# Altium footprint library Footprints.PcbLib: 207 footprints (part 11 of 13)
Each footprint in its own frame and in the unit in brackets; x right, y up, seen from the top. Pads: shape width x height; smd on the part's side, far side on the other; paste and mask are expansions set on the pad; w line width, h text height; cw(c..) or ccw(c..) is an arc to the next point about the centre after c.
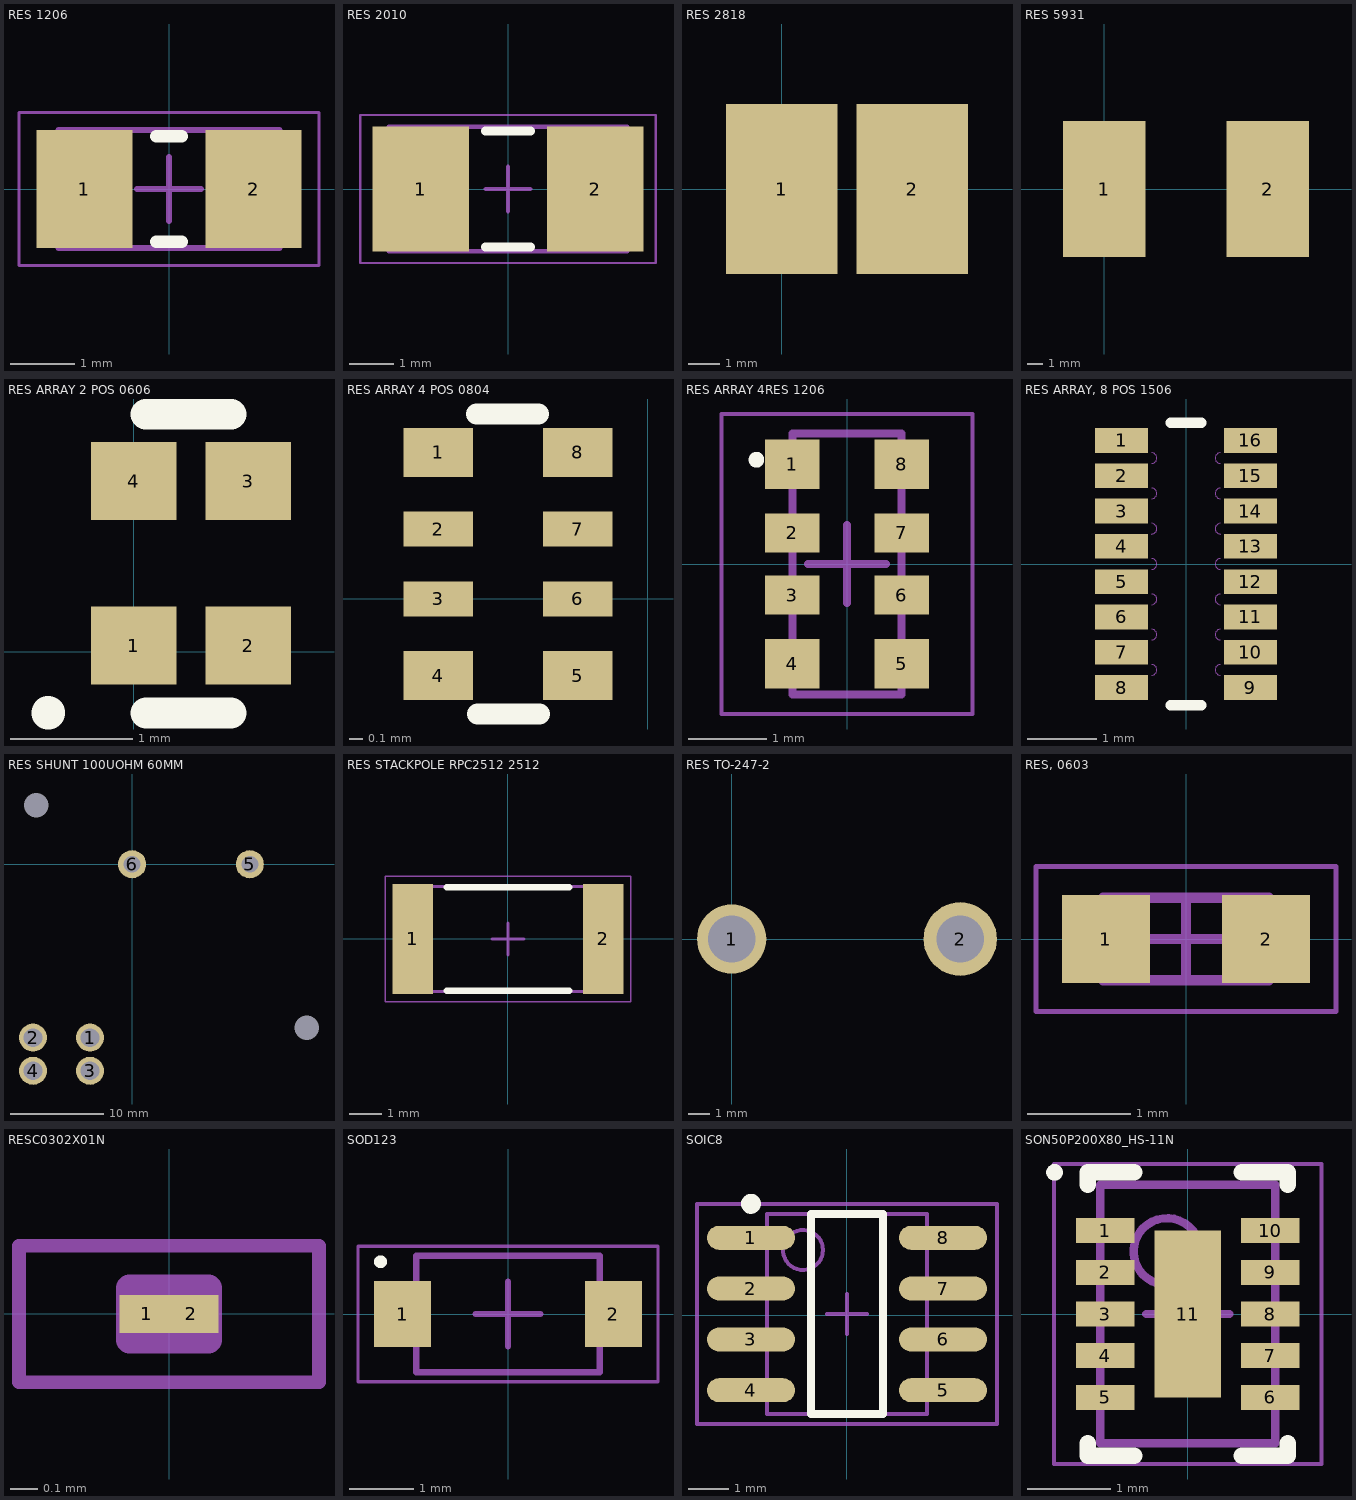
[diagram p10: the footprints below, top view; thin cyan lines are the x and y axes]

## RES 1206 [mm] "Chip Resistor, 2-Leads, Body 3.20x1.60mm, IPC Medium Density"
height 0.64
pads (2):
  rect 1.5x1.85 smd: 1(-1.325,0) 2(1.325,0)
Top Overlay:
  lines w0.2: -0.2,-0.825 0.2,-0.825 ; -0.2,0.825 0.2,0.825
Mechanical 13:
  lines w0.1: -1.725,-0.925 -1.725,0.925 1.725,0.925 1.725,-0.925 -1.725,-0.925
Mechanical 15:
  lines w0.05: -2.35,-1.2 -2.35,1.2 2.35,1.2 2.35,-1.2 -2.35,-1.2
  lines w0.1: -0.5,0 0.5,0 ; 0,-0.5 0,0.5
3D body "RES 1206.step": height 0.64, standoff 0, extent -1.725,-0.925 1.725,0.925

## RES 2010 [mm] "Chip Resistor, 2-Leads, Body 5.08x2.54mm, IPC Medium Density"
height 1.04
pads (2):
  rect 2.15x2.8 smd: 1(-1.95,0) 2(1.95,0)
Top Overlay:
  lines w0.2: -0.5,-1.3 0.5,-1.3 ; -0.5,1.3 0.5,1.3
Mechanical 13:
  lines w0.1: -2.665,-1.395 2.665,-1.395 2.665,1.395 -2.665,1.395 -2.665,-1.395
Mechanical 15:
  lines w0.05: -3.3,-1.65 3.3,-1.65 3.3,1.65 -3.3,1.65 -3.3,-1.65
  lines w0.1: -0.5,0 0.5,0 ; 0,-0.5 0,0.5
3D body "RES 2010.step": height 1.04, standoff 0, extent -2.665,-1.395 2.665,1.395

## RES 2818 [mm]
pads (2):
  rect 3.51x5.33 smd: 1(0,0) 2(4.1,0)
3D body "WSHM2818.stp": height 1.35, standoff -0.15, extent -1.525,-2.325 5.575,2.275

## RES 5931 [mm]
pads (2):
  rect 5.45x9 smd: 1(0,0) 2(10.8,0)
3D body "WSL5931 (0.003).stp": height 0.77, standoff 0, extent -2.25,-4 12.75,3.75

## RES ARRAY 2 POS 0606 [mm]
pads (4):
  rect 0.7x0.64 smd: 1(0,0.05) 2(0.94,0.05) 3(0.94,1.4) 4(0,1.4)
Top Overlay:
  circle w0.254: c-0.7,-0.5 r0.01
  lines w0.254: 0.1,-0.5 0.8,-0.5 ; 0.1,1.95 0.8,1.95
3D body "ACAS_0606.stp": height 0.45, standoff 0, extent -0.281,-0.072 1.219,1.528

## RES ARRAY 4 POS 0804 [mm] "Panasonic Electronic Components EXB-N8V511JX"
height 0.7
pads (8):
  rect 0.5x0.35 smd: 1(-1.5,1.05) 4(-1.5,-0.55) 5(-0.5,-0.55) 8(-0.5,1.05)
  rect 0.5x0.25 smd: 2(-1.5,0.5) 3(-1.5,0) 6(-0.5,0) 7(-0.5,0.5)
Top Overlay:
  lines w0.152: -1.225,1.325 -0.781,1.325 ; -1.219,-0.825 -0.775,-0.825
3D body "User Library-4xRes_0402.step": height 0.36, standoff -0.01, extent -1.5,-0.75 -0.5,1.25

## RES ARRAY 4RES 1206 [mm] "Chip Array, Flat, 8-Leads, Pitch 0.80mm,  Body 3.20x1.60mm,  IPC Medium Density"
height 1
pads (8):
  rect 0.7x0.64 smd: 1(-0.7,1.28) 4(-0.7,-1.28) 5(0.7,-1.28) 8(0.7,1.28)
  rect 0.7x0.5 smd: 2(-0.7,0.4) 3(-0.7,-0.4) 6(0.7,-0.4) 7(0.7,0.4)
Top Overlay:
  circle w0.1: c-1.162,1.338 r0.05
Mechanical 13:
  lines w0.1: -0.7,-1.675 -0.7,1.675 0.7,1.675 0.7,-1.675 -0.7,-1.675
Mechanical 15:
  lines w0.05: -1.61,-1.925 -1.61,1.925 1.61,1.925 1.61,-1.925 -1.61,-1.925
  lines w0.1: -0.5,0 0.5,0 ; 0,-0.5 0,0.5
3D body "ACAS 0612.stp": height 0.45, standoff 0, extent -0.813,-1.6 0.687,1.6

## RES ARRAY, 8 POS 1506 [mil]
pads (16):
  rect 30x14 smd: 1(-36.5,70) 2(-36.5,50) 3(-36.5,30) 4(-36.5,10) 5(-36.5,-10) 6(-36.5,-30) 7(-36.5,-50) 8(-36.5,-70) 9(36.5,-70) 10(36.5,-50) 11(36.5,-30) 12(36.5,-10) 13(36.5,10) 14(36.5,30) 15(36.5,50) 16(36.5,70)
Top Overlay:
  lines w6: -8.75,-80 8.75,-80 ; -8.75,80 8.75,80
Mechanical 13:
  lines w0: -19.5,-63 ccw(c-19.5,-60) -19.5,-57 ; -19.5,-43 ccw(c-19.5,-40) -19.5,-37 ; -19.5,-23 ccw(c-19.5,-20) -19.5,-17 ; -19.5,-3 ccw(c-19.5,0) -19.5,3 ; -19.5,17 ccw(c-19.5,20) -19.5,23 ; -19.5,37 ccw(c-19.5,40) -19.5,43 ; -19.5,57 ccw(c-19.5,60) -19.5,63 ; 19.5,-63 cw(c19.5,-60) 19.5,-57 ; 19.5,-43 cw(c19.5,-40) 19.5,-37 ; 19.5,-23 cw(c19.5,-20) 19.5,-17 ; 19.5,-3 cw(c19.5,0) 19.5,3 ; 19.5,17 cw(c19.5,20) 19.5,23 ; 19.5,37 cw(c19.5,40) 19.5,43 ; 19.5,57 cw(c19.5,60) 19.5,63
3D body "EXB2HV.stp": height 18.03, standoff 0, extent -20.51,-77.01 20.51,77.01

## RES SHUNT 100UOHM 60MM [mm]
pads (8):
  round 0 hole 2.6: 0(-10.25,6.3) 0(18.7,-17.5)
  round 3 hole 2: 1(-4.5,-18.55) 2(-10.6,-18.55) 3(-4.5,-22.1) 4(-10.6,-22.1)
  round 3 hole 1.8: 5(12.6,0) 6(0,0)
3D body "WSBM8518_100µO.STEP": height 6.58, standoff -21.08, extent -36.002,-29.031 48.986,11.463

## RES STACKPOLE RPC2512 2512 [mm] "Chip Resistor, 2-Leads, Body 6.30x3.10mm, IPC Medium Density"
height 0.65
pads (2):
  rect 1.25x3.4 smd: 1(-2.95,0) 2(2.95,0)
Top Overlay:
  lines w0.2: -1.9,-1.6 1.9,-1.6 ; -1.9,1.6 1.9,1.6
Mechanical 13:
  lines w0.1: -3.175,-1.625 -3.175,1.625 3.175,1.625 3.175,-1.625 -3.175,-1.625
Mechanical 15:
  lines w0.05: -3.8,-1.95 -3.8,1.95 3.8,1.95 3.8,-1.95 -3.8,-1.95
  lines w0.1: -0.5,0 0.5,0 ; 0,-0.5 0,0.5
3D body "RES STACKPOLE RPC2512 2512.step": height 0.65, standoff 0, extent -3.175,-1.625 3.175,1.625

## RES TO-247-2 [mm]
pads (2):
  round 3.3 hole 2.25: 1(0,0)
  round 3.5 hole 2.25: 2(10.88,0)
3D body: height 33.5, standoff -5.5, extent 10.88,0 10.88,0
3D body: height 30.47, standoff -5.5, extent 10.88,0 10.88,0
3D body "TO-247H.SLDPRT": height 25.5, standoff -10.47, extent -2.37,-2.75 13.13,2.25

## RES, 0603 [mm] "Chip Resistor, 2-Leads, Body 1.60x0.80mm, IPC Medium Density"
height 0.55
pads (2):
  rect 0.85x0.85 smd: 1(-0.775,0) 2(0.775,0)
Mechanical 13:
  lines w0.1: -0.8,-0.4 -0.8,0.4 0.8,0.4 0.8,-0.4 -0.8,-0.4
Mechanical 15:
  lines w0.05: -1.45,-0.7 -1.45,0.7 1.45,0.7 1.45,-0.7 -1.45,-0.7
  lines w0.1: -0.4,0 0.4,0 ; 0,-0.4 0,0.4
3D body: height 0.25, standoff 0, extent -0.8,-0.4 0.8,0.4

## RESC0302X01N [mm] "Chip Resistor, 2-Leads, Body 0.28x0.18mm, IPC Medium Density"
height 0.07
pads (2):
  rect 0.2x0.138 smd: 1(-0.081,0) 2(0.081,0)
Mechanical 13:
  lines w0.1: -0.145,-0.095 0.145,-0.095 0.145,0.095 -0.145,0.095 -0.145,-0.095
Mechanical 15:
  lines w0.05: -0.55,-0.25 0.55,-0.25 0.55,0.25 -0.55,0.25 -0.55,-0.25
  lines w0.1: -0.095,0 0.095,0 ; 0,-0.095 0,0.095
3D body: height 2.54, standoff -2.54, extent -2.528,-2.537 2.54,2.537

## SOD123 [mm] "SODFL, 2-Leads, Body 1.60x3.75mm, IPC Medium Density"
height 1.28
pads (2):
  rect 0.88x1.02 smd: 1(-1.635,0) 2(1.635,0)
Top Overlay:
  circle w0.1: c-1.975,0.81 r0.05
Mechanical 13:
  lines w0.1: -1.425,-0.9 1.425,-0.9 1.425,0.9 -1.425,0.9 -1.425,-0.9
Mechanical 15:
  lines w0.05: -2.325,-1.05 2.325,-1.05 2.325,1.05 -2.325,1.05 -2.325,-1.05
  lines w0.1: -0.5,0 0.5,0 ; 0,-0.5 0,0.5
3D body "SODFL375X128-2N.step": height 1.28, standoff 0, extent -1.875,-0.9 1.875,0.9

## SOIC8 [mm]
pads (8):
  oval 2.2x0.6 smd: 1(-2.394,1.935) 2(-2.394,0.665) 3(-2.394,-0.605) 4(-2.394,-1.875) 5(2.406,-1.875) 6(2.406,-0.605) 7(2.406,0.665) 8(2.406,1.935)
Top Overlay:
  circle w0.25: c-2.394,2.785 r0.125
  lines w0.2: -0.894,-2.47 0.906,-2.47 0.906,2.53 -0.894,2.53 -0.894,-2.47
Mechanical 13:
  circle w0.1: c-1.094,1.63 r0.5
  lines w0.1: -1.994,-2.47 2.006,-2.47 2.006,2.53 -1.994,2.53 -1.994,-2.47
Mechanical 15:
  lines w0.1: -0.494,0.03 0.506,0.03 ; 0.006,-0.47 0.006,0.53 ; -3.744,-2.72 3.756,-2.72 3.756,2.78 -3.744,2.78 -3.744,-2.72
3D body: height 1.75, standoff 0, extent -1.994,-2.47 2.006,2.53

## SON50P200X80_HS-11N [mm] "SON, 10-Leads, Body 3.00x2.00mm, Pitch 0.50mm, Thermal Pad 2.00x0.69mm, IPC Medium Density"
height 0.8
pads (11):
  rect 0.7x0.3 smd: 1(-0.99,1) 2(-0.99,0.5) 3(-0.99,0) 4(-0.99,-0.5) 5(-0.99,-1) 6(0.99,-1) 7(0.99,-0.5) 8(0.99,0) 9(0.99,0.5) 10(0.99,1)
  rect 0.8x2 smd: 11(0,0)
Top Overlay:
  circle w0.1: c-1.6,1.7 r0.05
  lines w0.2: -1.2,-1.55 -1.2,-1.7 -0.645,-1.7 ; -1.2,1.55 -1.2,1.7 -0.645,1.7 ; 0.645,-1.7 1.2,-1.7 1.2,-1.55 ; 0.645,1.7 1.2,1.7 1.2,1.55
Mechanical 13:
  circle w0.1: c-0.25,0.75 r0.4
  lines w0.1: -1.05,-1.55 -1.05,1.55 1.05,1.55 1.05,-1.55 -1.05,-1.55
Mechanical 15:
  lines w0.05: -1.605,-1.8 -1.605,1.8 1.605,1.8 1.605,-1.8 -1.605,-1.8
  lines w0.1: -0.5,0 0.5,0 ; 0,-0.5 0,0.5
3D body "SON50P200X80_HS-11N.step": height 0.8, standoff 0, extent -1.051,-1.55 1.051,1.55